# Altium footprint library HubProModel_v1.PcbLib: 67 footprints (part 1 of 5)
Each footprint in its own frame and in the unit in brackets; x right, y up, seen from the top. Pads: shape width x height; smd on the part's side, far side on the other; paste and mask are expansions set on the pad; w line width, h text height; cw(c..) or ccw(c..) is an arc to the next point about the centre after c.
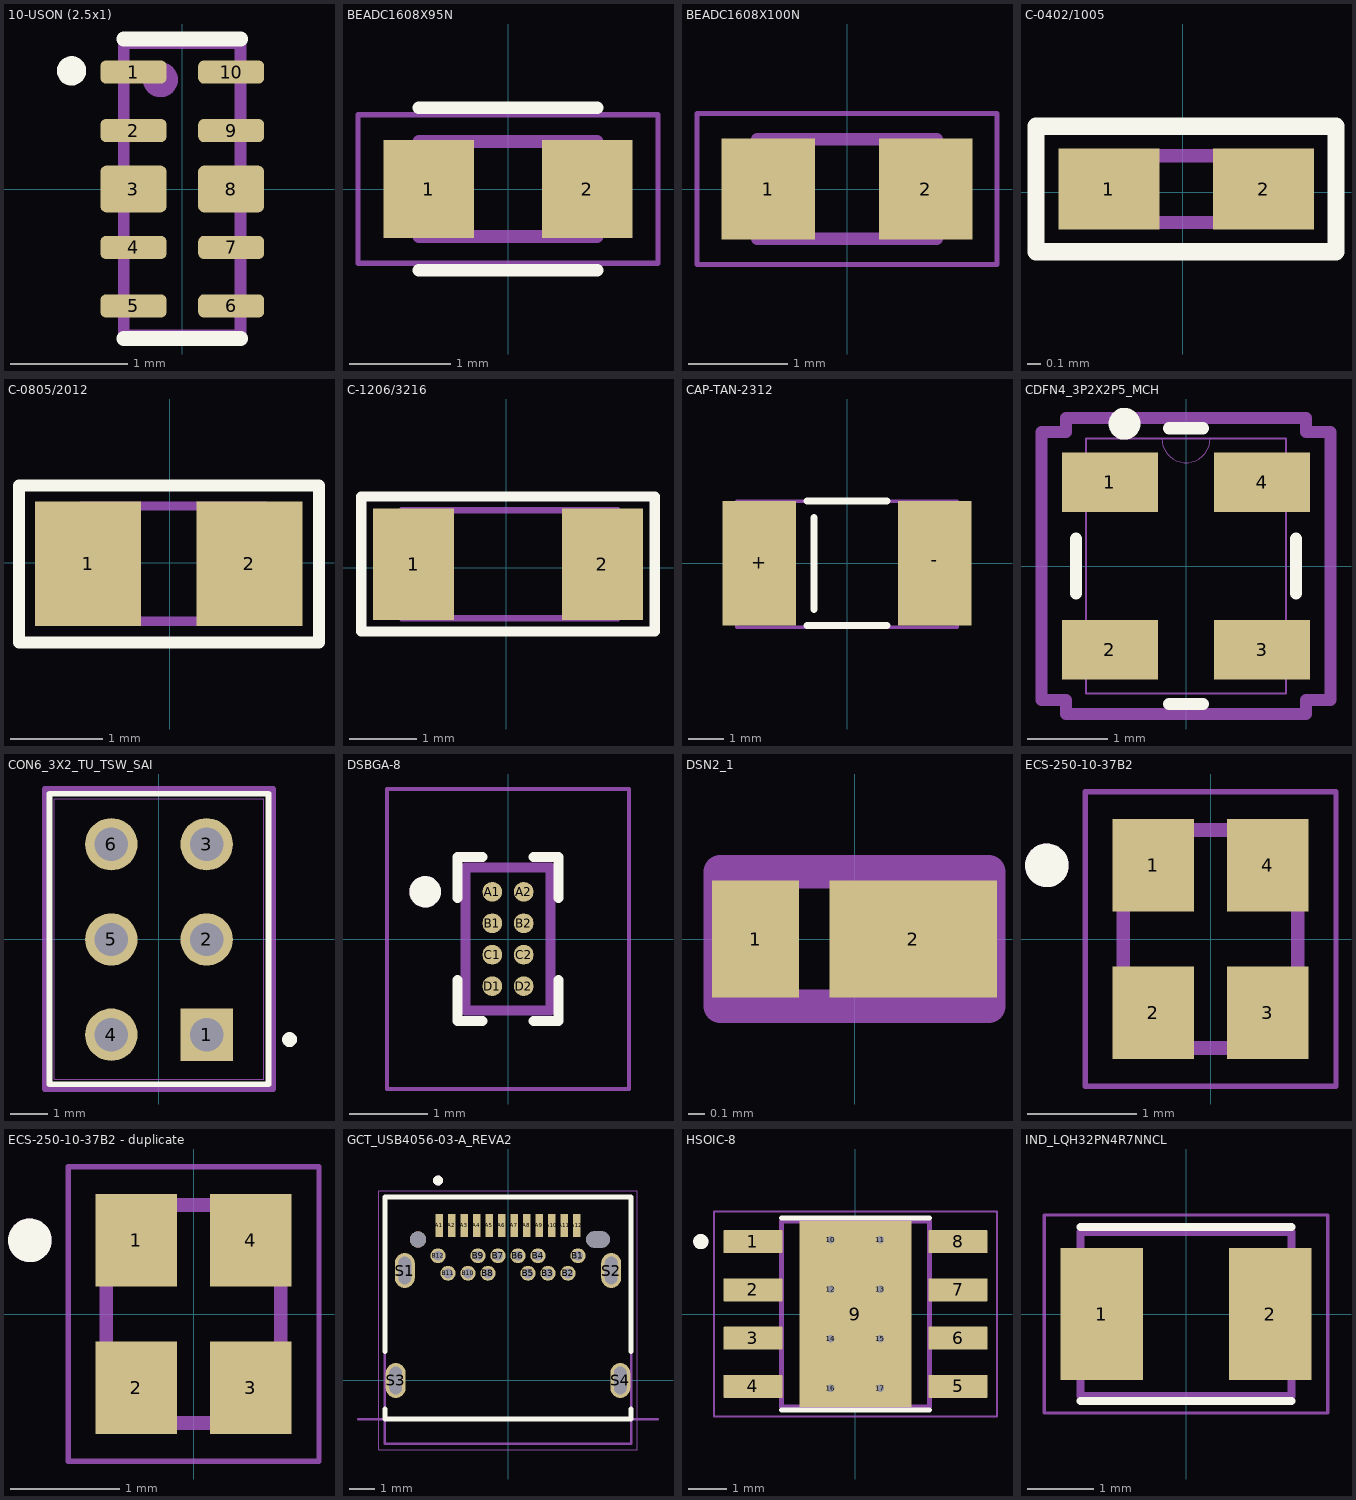
[diagram p0: the footprints below, top view; thin cyan lines are the x and y axes]

## 10-USON (2.5x1) [mm] "TVS DIODE 5.5V 8V 10USON"
pads (10):
  rrect50% 0.565x0.2 smd mask+0: 1(-0.417,1) 2(-0.417,0.5) 4(-0.417,-0.5) 5(-0.417,-1) 6(0.417,-1) 7(0.417,-0.5) 9(0.417,0.5) 10(0.417,1)
  rrect25% 0.565x0.4 smd paste-1 mask+0: 3(-0.417,0) 8(0.417,0)
Top Overlay:
  circle w0.15: c-0.948,1.01 r0.05
  lines w0.127: -0.501,1.283 0.499,1.283 ; -0.501,-1.279 0.499,-1.279
Top Paste:
  drawing of 2 lines, arcs and shapes, not listed
Top Solder:
  region: 0.77,-0.27 0.065,-0.27 0.065,0.27 0.77,0.27
  region: -0.065,-0.27 -0.77,-0.27 -0.77,0.27 -0.065,0.27
  region: 0.77,-1.17 0.065,-1.17 0.065,-0.83 0.77,-0.83
  region: 0.77,-0.67 0.065,-0.67 0.065,-0.33 0.77,-0.33
  region: 0.77,0.33 0.065,0.33 0.065,0.67 0.77,0.67
  region: 0.77,0.83 0.065,0.83 0.065,1.17 0.77,1.17
  region: -0.065,-1.17 -0.77,-1.17 -0.77,-0.83 -0.065,-0.83
  region: -0.065,-0.67 -0.77,-0.67 -0.77,-0.33 -0.065,-0.33
  region: -0.065,0.33 -0.77,0.33 -0.77,0.67 -0.065,0.67
  region: -0.065,0.83 -0.77,0.83 -0.77,1.17 -0.065,1.17
Top Assembly:
  circle w0.2: c-0.188,0.935 r0.05
  lines w0.1: -0.5,-1.249 0.498,-1.249 0.498,1.247 -0.131,1.247 -0.5,1.247 -0.5,-1.249
  text "'.Designator'" at -3.275,-2.453 h1.27
3D body "TPD4EUSB30DQAR.STEP": height 0.55, standoff 0, extent -0.5,-1.25 0.5,1.25

## BEADC1608X95N [mm] "FERRITE BEAD, 0.05OHM, 1.7A, 0603, FULL REEL"
pads (2):
  rect 0.9x0.97 smd: 1(-0.785,0) 2(0.785,0)
Top Overlay:
  lines w0.127: -0.88,-0.805 0.88,-0.805 ; -0.88,0.805 0.88,0.805
Mechanical 13:
  lines w0.127: -0.88,-0.47 0.88,-0.47 0.88,0.47 -0.88,0.47 -0.88,-0.47
Mechanical 15:
  lines w0.05: -1.485,-0.735 1.485,-0.735 1.485,0.735 -1.485,0.735 -1.485,-0.735

## BEADC1608X100N [mm] "Ferrite Chip Bead; Series:FC FB; Current Rating:6A; Resistance:0.028ohm; Package/Case:1812; Features:For upper MHz range applications; Ferrite Grade:HM; Frequency:100MHz; Impedance:23ohm; Impedance Tolerance:Â± 30% ;RoHS Compliant: Yes"
pads (2):
  rect 0.94x1.02 smd: 1(-0.79,0) 2(0.79,0)
Mechanical 13:
  lines w0.127: -0.9,-0.5 0.9,-0.5 0.9,0.5 -0.9,0.5 -0.9,-0.5
Mechanical 15:
  lines w0.05: -1.508,-0.758 1.508,-0.758 1.508,0.758 -1.508,0.758 -1.508,-0.758

## C-0402/1005 [mm] "Chip Capacitor, 2-Leads, Body 1.02x0.51mm, IPC Medium Density"
height 0.52
pads (2):
  rect 0.75x0.6 smd: 1(-0.55,0.022) 2(0.6,0.022)
Top Overlay:
  lines w0.127: -1.09,-0.443 1.137,-0.443 1.137,0.489 -1.09,0.489 -1.09,-0.443
Top Assembly:
  lines w0.1: -0.478,-0.225 0.524,-0.225 0.524,0.271 -0.478,0.271 -0.478,-0.225
  text "'.Designator'" at -2.8,-1.6 h1
3D body "0402 cap.STEP": height 0.52, standoff 0, extent -0.483,-0.241 0.517,0.283

## C-0805/2012 [mm] "Chip Capacitor, 2-Leads, Body 2.00x1.20mm, IPC Medium Density"
height 1.15
pads (2):
  rect 1.15x1.35 smd: 1(-0.883,-0.009) 2(0.867,-0.009)
Top Overlay:
  lines w0.127: -1.632,-0.864 -1.632,-0.633 -1.632,0.838 1.621,0.838 1.621,-0.864 -1.632,-0.864
Top Assembly:
  lines w0.1: -0.958,-0.634 -0.958,0.616 1.042,0.616 1.042,-0.634 -0.958,-0.634
  text "'.Designator'" at -2.987,-1.896 h1
3D body "0805 cap.STEP": height 1.26, standoff -0.02, extent -1.02,-0.644 0.98,0.63

## C-1206/3216 [mm] "Chip Capacitor, 2-Leads, Body 3.25x1.60mm, IPC Medium Density"
height 1.6
pads (2):
  rect 1.2x1.65 smd: 1(-1.373,0.055) 2(1.427,0.055)
Top Overlay:
  lines w0.15: -2.15,-0.94 -2.15,0.714 -2.15,1.058 2.203,1.058 2.203,-0.94 -2.15,-0.94
Top Assembly:
  lines w0.1: -1.548,-0.745 -1.548,0.855 1.652,0.855 1.652,-0.745 -1.548,-0.745
  text "'.Designator'" at -3.2,1.45 h1.27
3D body "1206 cap.STEP": height 1.62, standoff 0, extent -1.59,-0.762 1.61,0.862

## CAP-TAN-2312 [mm]
pads (2):
  rect 2.07x3.51 smd: +(-2.471,0) -(2.471,0)
Top Overlay:
  lines w0.2: -1.12,-1.75 1.12,-1.75 ; -1.12,1.75 1.12,1.75 ; -0.932,-1.307 -0.932,1.293
Top Assembly:
  lines w0.1: -1.257,1.742 3.1,1.742 3.1,-1.8 -3.1,-1.8 -3.1,1.742 -1.2,1.742
  text "'.Designator'" at -3.022,-3.609 h1.27
3D body "t491c106m025at.stp": height 2.81, standoff 0.01, extent -3.126,-1.746 3.174,1.754

## CDFN4_3P2X2P5_MCH [mm] "MEMS OSC XO 25.0000MHZ CMOS SMD"
pads (4):
  rect 1.205x0.749 smd paste+0 mask+0: 1(-0.952,1.05) 2(-0.952,-1.05) 3(0.952,-1.05) 4(0.952,1.05)
Top Overlay:
  circle w0.2: c-0.77,1.782 r0.1
  lines w0.152: -1.377,-0.343 -1.377,0.343 ; -0.211,-1.727 0.211,-1.727 ; -0.211,1.727 0.211,1.727 ; 1.377,-0.343 1.377,0.343
Mechanical 13:
  lines w0: -0.305,1.6 ccw(c0,1.6) 0.305,1.6
  lines w0.025: -1.25,-1.6 1.25,-1.6 1.25,1.6 -1.25,1.6 -1.25,-1.6
Mechanical 15:
  lines w0.152: -1.809,-1.679 -1.809,1.679 -1.504,1.679 -1.504,1.854 1.504,1.854 1.504,1.679 1.809,1.679 1.809,-1.679 1.504,-1.679 1.504,-1.854 -1.504,-1.854 -1.504,-1.679 -1.809,-1.679
3D body "CDFN4_3P2X2P5_MCH.step": height 0.81, standoff 0, extent -1.25,-1.6 1.25,1.6

## CON6_3X2_TU_TSW_SAI [mil] "CONN HEADER VERT 6POS 2.54MM"
height 35.04
pads (6):
  rect 55x55 hole 35 paste-99999 mask+0: 1(50,-100)
  round 55 hole 35 paste-99999 mask+0: 2(50,0) 3(50,100) 4(-50,-100) 5(-50,0) 6(-50,100)
Top Overlay:
  lines w6: -115,-152 -115,153 115,153 115,-152 -115,-152
  lines w7.87: 140.98,-104.33 ccw(c137.11,-105.08) 141.05,-105.08
Bottom Overlay:
  circle w7.87: c137.02,-104.71 r3.94
Mechanical 13:
  circle w0: c50,-100 r10
  lines w1: -110,-147 -110,148 110,148 110,-147 -110,-147
Mechanical 15:
  lines w6: -120,-157 -87.5,-157 87.5,-157 120,-157 120,158 87.5,158 -87.5,158 -120,158 -120,-157

## DSBGA-8 [mm] "High Efficient Single Inductor Buck-Boost Converter with 1-A Switches"
pads (8):
  round 0.25 smd: A1(-0.2,0.6) A2(0.2,0.6) B1(-0.2,0.2) B2(0.2,0.2) C1(-0.2,-0.2) C2(0.2,-0.2) D1(-0.2,-0.6) D2(0.2,-0.6)
Top Overlay:
  circle w0.2: c-1.053,0.6 r0.1
  lines w0.127: -0.645,-0.523 -0.645,-1.045 -0.323,-1.045 ; -0.645,0.523 -0.645,1.045 -0.323,1.045 ; 0.323,-1.045 0.645,-1.045 0.645,-0.523 ; 0.323,1.045 0.645,1.045 0.645,0.523
Mechanical 13:
  circle w0.2: c-1.053,0.6 r0.1
  lines w0.127: -0.538,-0.907 -0.538,0.907 0.538,0.907 0.538,-0.907 -0.538,-0.907
Mechanical 15:
  lines w0.05: -1.538,-1.907 -1.538,1.907 1.538,1.907 1.538,-1.907 -1.538,-1.907

## DSN2_1 [mm] "Diode Schottky 30 V 2A (DC) Surface Mount 2-DSN (1.6x.80)"
pads (2):
  rect 0.52x0.7 smd: 1(-0.59,0)
  rect 1x0.7 smd: 2(0.35,0)
Mechanical 13:
  lines w0.2: -0.8,-0.4 0.8,-0.4 0.8,0.4 -0.8,0.4 -0.8,-0.4

## ECS-250-10-37B2 [mm] "25 MHz ±10ppm Crystal 10pF 50 Ohms 4-SMD, No Lead"
height 0.89
pads (4):
  rect 0.75x0.85 smd: 1(-0.525,0.675) 2(-0.525,-0.675) 3(0.525,-0.675) 4(0.525,0.675)
Top Overlay:
  circle w0.2: c-1.5,0.675 r0.1
Mechanical 13:
  circle w0.2: c-1.5,0.675 r0.1
  lines w0.127: -0.8,-1 0.8,-1 0.8,1 -0.8,1 -0.8,-1
Mechanical 15:
  lines w0.05: -1.15,-1.35 1.15,-1.35 1.15,1.35 -1.15,1.35 -1.15,-1.35
3D body "step_temp.STEP": height 0.5, standoff 0, extent -0.8,-1 0.8,1

## ECS-250-10-37B2 - duplicate [mm] "25 MHz ±10ppm Crystal 10pF 50 Ohms 4-SMD, No Lead"
height 0.89
pads (4):
  rect 0.75x0.85 smd: 1(-0.525,0.675) 2(-0.525,-0.675) 3(0.525,-0.675) 4(0.525,0.675)
Top Overlay:
  circle w0.2: c-1.5,0.675 r0.1
Mechanical 13:
  circle w0.2: c-1.5,0.675 r0.1
  lines w0.127: -0.8,-1 0.8,-1 0.8,1 -0.8,1 -0.8,-1
Mechanical 15:
  lines w0.05: -1.15,-1.35 1.15,-1.35 1.15,1.35 -1.15,1.35 -1.15,-1.35
3D body "step_temp.STEP": height 0.5, standoff 0, extent -0.8,-1 0.8,1

## GCT_USB4056-03-A_REVA2 [mm] "USB-C (USB TYPE-C) USB 3.2 Gen 2 (USB 3.1 Gen 2, Superspeed + (USB 3.1)) Receptacle Connector 24 Position Surface Mount, Right Angle; Through Hole"
height 3.31
pads (30):
  rect 0.3x0.9 smd: A1(-2.75,6.2) A2(-2.25,6.2) A3(-1.75,6.2) A4(-1.25,6.2) A5(-0.75,6.2) A6(-0.25,6.2) A7(0.25,6.2) A8(0.75,6.2) A9(1.25,6.2) A10(1.75,6.2) A11(2.25,6.2) A12(2.75,6.2)
  round 0.6 hole 0.4: B1(2.8,4.99) B2(2.4,4.29) B3(1.6,4.29) B4(1.2,4.99) B5(0.8,4.29) B6(0.4,4.99) B7(-0.4,4.99) B8(-0.8,4.29) B9(-1.2,4.99) B10(-1.6,4.29) B11(-2.4,4.29) B12(-2.8,4.99)
  oval 0.8x1.4 hole 0.5 slot 1.1 at 90 deg: S1(-4.13,4.4) S2(4.13,4.4) S3(-4.49,0) S4(4.49,0)
  round 0.65 hole 0.65 unplated: ""(-3.6,5.64)
  oval 0.65x0 hole 0.65 slot 0.95 at 0 deg unplated: ""(3.6,5.64)
Top Overlay:
  circle w0.2: c-2.8,8 r0.1
  lines w0.2: -4.925,-1.15 -4.925,-1.55 4.925,-1.55 4.925,-1.15 ; -4.925,1.15 -4.925,7.34 4.925,7.34 4.925,1.15
Top Solder:
  region: 3.772,6.064 3.794,6.063 3.816,6.06 3.838,6.056 3.86,6.051 3.881,6.044 3.902,6.037 3.923,6.028 3.943,6.019 3.962,6.008 3.981,5.996 4,5.984 4.017,5.97 4.034,5.956 4.051,5.941 4.066,5.924 4.08,5.907 4.094,5.89 4.106,5.871 4.118,5.853 4.129,5.833 4.138,5.813 4.147,5.792 4.154,5.771 4.161,5.75 4.166,5.728 4.17,5.706 4.173,5.684 4.174,5.662 4.175,5.64 4.174,5.618 4.173,5.596 4.17,5.574 4.166,5.552 4.161,5.53 4.154,5.509 4.147,5.488 4.138,5.467 4.129,5.447 4.118,5.428 4.106,5.409 4.094,5.39 4.08,5.373 4.066,5.356 4.051,5.339 4.034,5.324 4.017,5.31 4,5.296 3.981,5.284 3.962,5.272 3.943,5.261 3.923,5.252 3.902,5.243 3.881,5.236 3.86,5.229 3.838,5.224 3.816,5.22 3.794,5.217 3.772,5.216 3.75,5.215 3.45,5.215 3.428,5.216 3.406,5.217 3.384,5.22 3.362,5.224 3.34,5.229 3.319,5.236 3.298,5.243 3.277,5.252 3.257,5.261 3.237,5.272 3.219,5.284 3.2,5.296 3.183,5.31 3.166,5.324 3.149,5.339 3.134,5.356 3.12,5.373 3.106,5.39 3.094,5.409 3.082,5.428 3.071,5.447 3.062,5.467 3.053,5.488 3.046,5.509 3.039,5.53 3.034,5.552 3.03,5.574 3.027,5.596 3.026,5.618 3.025,5.64 3.026,5.662 3.027,5.684 3.03,5.706 3.034,5.728 3.039,5.75 3.046,5.771 3.053,5.792 3.062,5.813 3.071,5.833 3.082,5.853 3.094,5.871 3.106,5.89 3.12,5.907 3.134,5.924 3.149,5.941 3.166,5.956 3.183,5.97 3.2,5.984 3.219,5.996 3.237,6.008 3.257,6.019 3.277,6.028 3.298,6.037 3.319,6.044 3.34,6.051 3.362,6.056 3.384,6.06 3.406,6.063 3.428,6.064 3.45,6.065 3.75,6.065
Bottom Solder:
  region: 3.772,6.064 3.794,6.063 3.816,6.06 3.838,6.056 3.86,6.051 3.881,6.044 3.902,6.037 3.923,6.028 3.943,6.019 3.962,6.008 3.981,5.996 4,5.984 4.017,5.97 4.034,5.956 4.051,5.941 4.066,5.924 4.08,5.907 4.094,5.89 4.106,5.871 4.118,5.853 4.129,5.833 4.138,5.813 4.147,5.792 4.154,5.771 4.161,5.75 4.166,5.728 4.17,5.706 4.173,5.684 4.174,5.662 4.175,5.64 4.174,5.618 4.173,5.596 4.17,5.574 4.166,5.552 4.161,5.53 4.154,5.509 4.147,5.488 4.138,5.467 4.129,5.447 4.118,5.428 4.106,5.409 4.094,5.39 4.08,5.373 4.066,5.356 4.051,5.339 4.034,5.324 4.017,5.31 4,5.296 3.981,5.284 3.962,5.272 3.943,5.261 3.923,5.252 3.902,5.243 3.881,5.236 3.86,5.229 3.838,5.224 3.816,5.22 3.794,5.217 3.772,5.216 3.75,5.215 3.45,5.215 3.428,5.216 3.406,5.217 3.384,5.22 3.362,5.224 3.34,5.229 3.319,5.236 3.298,5.243 3.277,5.252 3.257,5.261 3.237,5.272 3.219,5.284 3.2,5.296 3.183,5.31 3.166,5.324 3.149,5.339 3.134,5.356 3.12,5.373 3.106,5.39 3.094,5.409 3.082,5.428 3.071,5.447 3.062,5.467 3.053,5.488 3.046,5.509 3.039,5.53 3.034,5.552 3.03,5.574 3.027,5.596 3.026,5.618 3.025,5.64 3.026,5.662 3.027,5.684 3.03,5.706 3.034,5.728 3.039,5.75 3.046,5.771 3.053,5.792 3.062,5.813 3.071,5.833 3.082,5.853 3.094,5.871 3.106,5.89 3.12,5.907 3.134,5.924 3.149,5.941 3.166,5.956 3.183,5.97 3.2,5.984 3.219,5.996 3.237,6.008 3.257,6.019 3.277,6.028 3.298,6.037 3.319,6.044 3.34,6.051 3.362,6.056 3.384,6.06 3.406,6.063 3.428,6.064 3.45,6.065 3.75,6.065
Mechanical 13:
  circle w0.2: c-2.8,8 r0.1
  lines w0.1: -6,-1.55 6,-1.55 ; -4.925,-2.53 -4.925,7.34 4.925,7.34 4.925,-2.53 -4.925,-2.53
  text "PCB Edge" at 5.5,-1.3 h1
Mechanical 15:
  lines w0.05: -5.175,-2.78 -5.175,7.59 5.175,7.59 5.175,-2.78 -5.175,-2.78
3D body "step_temp.STEP": height 3.26, standoff -1.2, extent -4.925,-2.53 4.925,7.34

## HSOIC-8 [mm] "3.5V to 28V Input, 3.5A, 1MHz Step-Down Converter with Eco-mode"
pads (17):
  rrect5% 1.55x0.6 smd mask+0: 1(-2.7,1.905) 2(-2.7,0.635) 3(-2.7,-0.635) 4(-2.7,-1.905) 5(2.7,-1.905) 6(2.7,-0.635) 7(2.7,0.635) 8(2.7,1.905)
  rect 2.95x4.9 smd paste-3 mask+0: 9(0,0)
  round 0.3 hole 0.2: 10(-0.65,1.95) 11(0.65,1.95) 12(-0.65,0.65) 13(0.65,0.65) 14(-0.65,-0.65) 15(0.65,-0.65) 16(-0.65,-1.95) 17(0.65,-1.95)
Top Overlay:
  circle w0.2: c-4.07,1.905 r0.1
  lines w0.127: -1.95,-2.525 1.95,-2.525 ; -1.95,2.525 1.95,2.525
Top Paste:
  region: 1.355,-1.7 -1.355,-1.7 -1.355,1.7 1.355,1.7
Top Solder:
  drawing of 9 lines, arcs and shapes, not listed
Mechanical 13:
  circle w0.2: c-4.07,1.905 r0.1
  lines w0.127: -1.95,-2.45 -1.95,2.45 1.95,2.45 1.95,-2.45 -1.95,-2.45
Mechanical 15:
  lines w0.05: -3.725,-2.7 -3.725,2.7 3.725,2.7 3.725,-2.7 -3.725,-2.7
3D body "step_temp.STEP": height 1.7, standoff 0, extent -3,-2.45 3,2.45

## IND_LQH32PN4R7NNCL [mm] "INDUCTOR, POWER, 4.7UH, +/-30%; Product Range:MURATA - LQH Series Chip Inductors; Inductance:4.7µH; Inductance Tolerance:± 30%; DC Resistance Max:0.155ohm; DC Current Rating:1.2A; Self Resonant Frequency:40MHz; Inductor Case Style:1210 [3225 Metric]; SVHC:No SVHC (19-Dec-2012)"
pads (2):
  rect 1.25x2 smd: 1(-1.275,0) 2(1.275,0)
Top Overlay:
  lines w0.127: -1.6,-1.32 1.6,-1.32 ; -1.6,1.32 1.6,1.32
Mechanical 13:
  lines w0.127: -1.6,-1.25 -1.6,1.25 1.6,1.25 1.6,-1.25 -1.6,-1.25
Mechanical 15:
  lines w0.05: -2.15,-1.5 -2.15,1.5 2.15,1.5 2.15,-1.5 -2.15,-1.5